# Altium footprint library Capacitance.PcbLib: 176 footprints (part 6 of 11)
Each footprint in its own frame and in the unit in brackets; x right, y up, seen from the top. Pads: shape width x height; smd on the part's side, far side on the other; paste and mask are expansions set on the pad; w line width, h text height; cw(c..) or ccw(c..) is an arc to the next point about the centre after c.
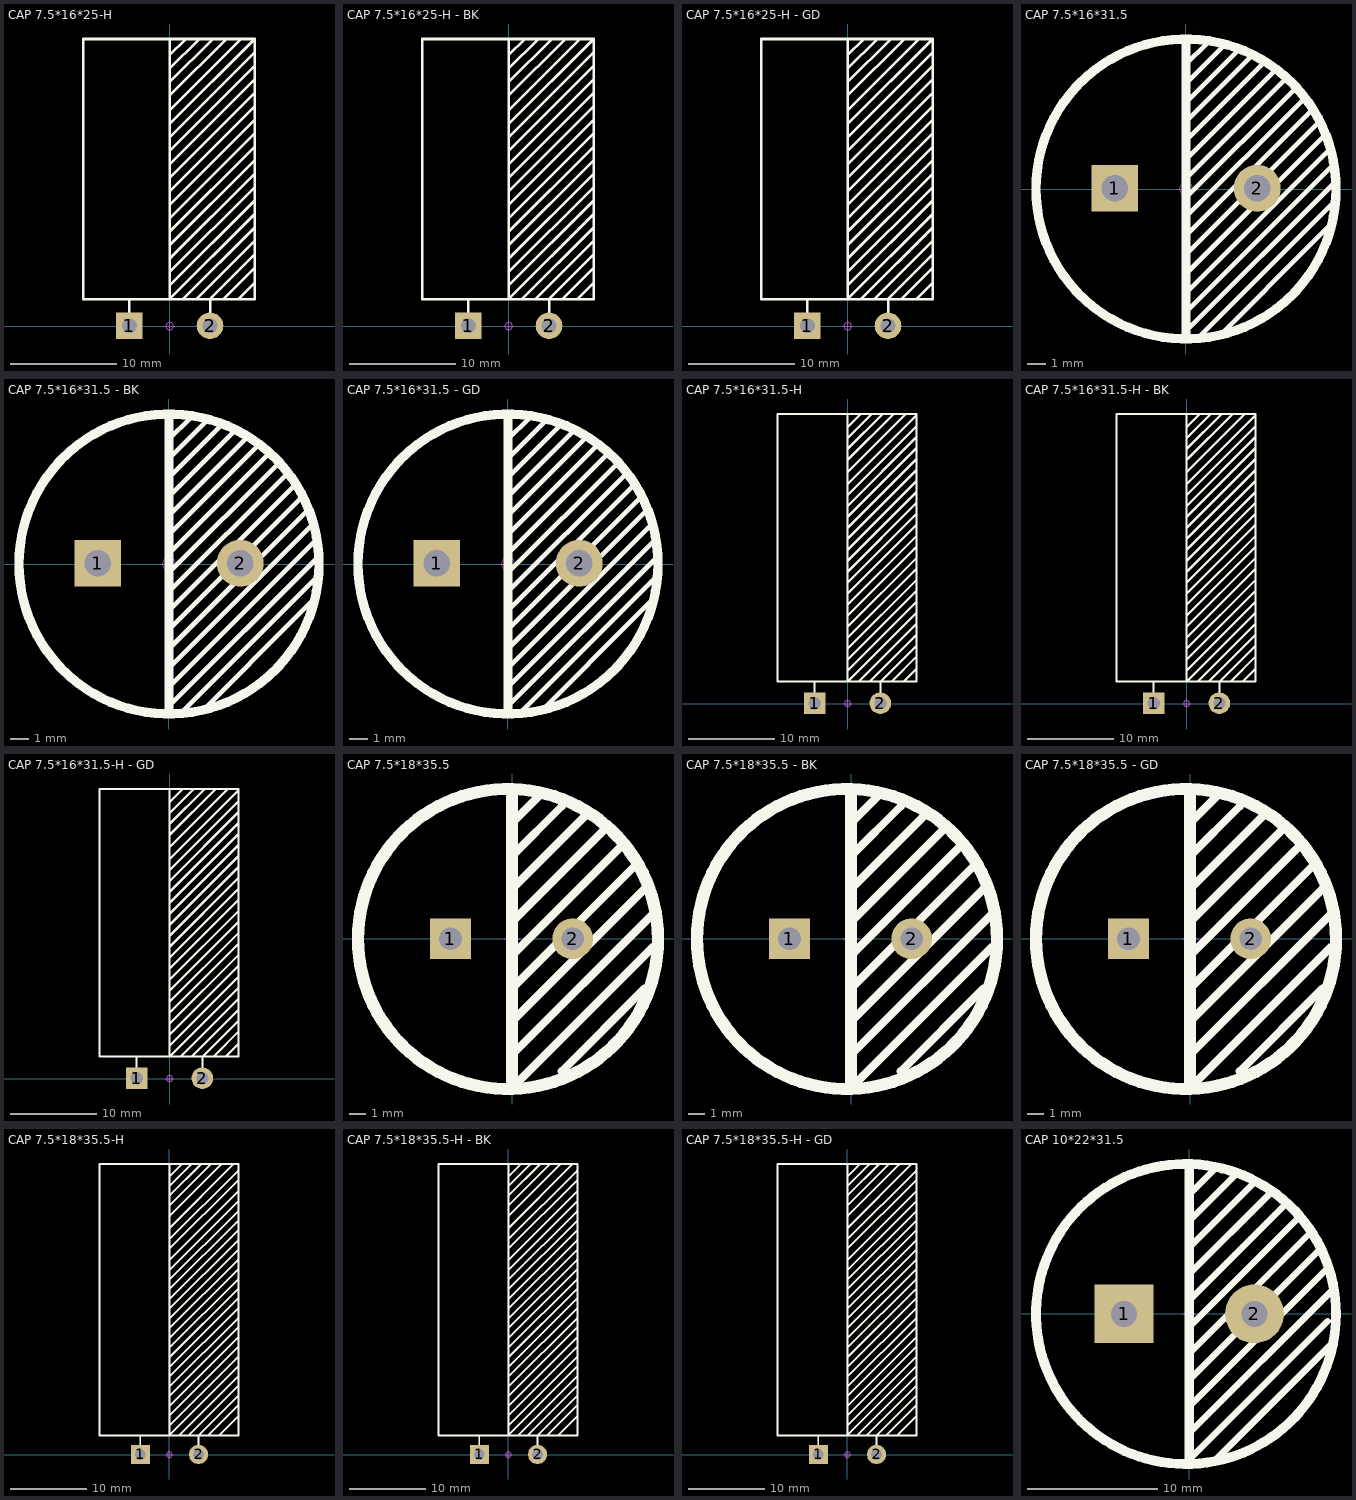
[diagram p5: the footprints below, top view; thin cyan lines are the x and y axes]

## CAP 7.5*16*25-H [mm] "ï¿½Å¾ï¿½7.5mmÖ±ï¿½ï¿½16mmï¿½ß¶ï¿½25mm"
pads (2):
  rect 2.5x2.5 hole 1.4: 1(-3.8,0.038)
  round 2.5 hole 1.4: 2(3.8,0.038)
Top Overlay:
  lines w0.254: -3.81,1.27 -3.81,2.54 ; 0,3.81 8.001,11.811 ; 0,5.08 8.001,13.081 ; 0,6.35 8.001,14.351 ; 0,7.62 7.938,15.557 ; 0,8.89 8.001,16.891 ; 0,10.16 7.938,18.098 ; 0,11.43 8.001,19.431 ; 0,12.7 7.938,20.637 ; 0,13.97 7.938,21.907 ; 0,15.24 7.938,23.177 ; 0,16.51 7.938,24.447 ; 0,17.78 7.938,25.717 ; 0,19.05 7.929,26.979 ; 0,20.32 6.731,27.051 ; 0,21.717 5.334,27.051 ; 0,22.987 4.064,27.051 ; 0,24.257 2.794,27.051 ; 0,25.527 1.524,27.051 ; 0,27.051 0,2.54 8.001,10.541 ; 1.27,2.54 8.001,9.271 ; 2.54,2.54 8.001,8.001 ; 3.81,1.27 3.81,2.54 8.001,6.731 ; 5.08,2.54 8.001,5.461 ; 6.477,2.54 8.001,4.064 ; -8.128,2.54 8.001,2.54 8.001,27.051 -8.128,27.051 -8.128,2.54
Mechanical 15:
  circle w0.05: c0,0 r0.35
  lines w0.05: -0.5,0 0.5,0 ; 0,-0.5 0,0.5
3D body "CAP 7.5X16X25-H.STEP": height 16.03, standoff -3.47, extent -8.05,-0.462 7.96,26.948

## CAP 7.5*16*25-H - BK [mm] "ï¿½Å¾ï¿½7.5mmÖ±ï¿½ï¿½16mmï¿½ß¶ï¿½25mm"
pads (2):
  rect 2.5x2.5 hole 1.4: 1(-3.8,0.038)
  round 2.5 hole 1.4: 2(3.8,0.038)
Top Overlay:
  lines w0.254: -3.81,1.27 -3.81,2.54 ; 0,3.81 8.001,11.811 ; 0,5.08 8.001,13.081 ; 0,6.35 8.001,14.351 ; 0,7.62 7.938,15.557 ; 0,8.89 8.001,16.891 ; 0,10.16 7.938,18.098 ; 0,11.43 8.001,19.431 ; 0,12.7 7.938,20.637 ; 0,13.97 7.938,21.907 ; 0,15.24 7.938,23.177 ; 0,16.51 7.938,24.447 ; 0,17.78 7.938,25.717 ; 0,19.05 7.929,26.979 ; 0,20.32 6.731,27.051 ; 0,21.717 5.334,27.051 ; 0,22.987 4.064,27.051 ; 0,24.257 2.794,27.051 ; 0,25.527 1.524,27.051 ; 0,27.051 0,2.54 8.001,10.541 ; 1.27,2.54 8.001,9.271 ; 2.54,2.54 8.001,8.001 ; 3.81,1.27 3.81,2.54 8.001,6.731 ; 5.08,2.54 8.001,5.461 ; 6.477,2.54 8.001,4.064 ; -8.128,2.54 8.001,2.54 8.001,27.051 -8.128,27.051 -8.128,2.54
Mechanical 15:
  circle w0.05: c0,0 r0.35
  lines w0.05: -0.5,0 0.5,0 ; 0,-0.5 0,0.5
3D body "CAP 7.5X16X25-H.STEP": height 16.03, standoff -3.48, extent -8.05,-0.462 7.96,26.948

## CAP 7.5*16*25-H - GD [mm] "ï¿½Å¾ï¿½7.5mmÖ±ï¿½ï¿½16mmï¿½ß¶ï¿½25mm"
pads (2):
  rect 2.5x2.5 hole 1.4: 1(-3.8,0.038)
  round 2.5 hole 1.4: 2(3.8,0.038)
Top Overlay:
  lines w0.254: -3.81,1.27 -3.81,2.54 ; 0,3.81 8.001,11.811 ; 0,5.08 8.001,13.081 ; 0,6.35 8.001,14.351 ; 0,7.62 7.938,15.557 ; 0,8.89 8.001,16.891 ; 0,10.16 7.938,18.098 ; 0,11.43 8.001,19.431 ; 0,12.7 7.938,20.637 ; 0,13.97 7.938,21.907 ; 0,15.24 7.938,23.177 ; 0,16.51 7.938,24.447 ; 0,17.78 7.938,25.717 ; 0,19.05 7.929,26.979 ; 0,20.32 6.731,27.051 ; 0,21.717 5.334,27.051 ; 0,22.987 4.064,27.051 ; 0,24.257 2.794,27.051 ; 0,25.527 1.524,27.051 ; 0,27.051 0,2.54 8.001,10.541 ; 1.27,2.54 8.001,9.271 ; 2.54,2.54 8.001,8.001 ; 3.81,1.27 3.81,2.54 8.001,6.731 ; 5.08,2.54 8.001,5.461 ; 6.477,2.54 8.001,4.064 ; -8.128,2.54 8.001,2.54 8.001,27.051 -8.128,27.051 -8.128,2.54
Mechanical 15:
  circle w0.05: c0,0 r0.35
  lines w0.05: -0.5,0 0.5,0 ; 0,-0.5 0,0.5
3D body "CAP 7.5X16X25-H.STEP": height 16.03, standoff -3.48, extent -8.05,-0.462 7.96,26.948

## CAP 7.5*16*31.5 [mm] "ï¿½Å¾ï¿½7.5mmÖ±ï¿½ï¿½16mmï¿½ß¶ï¿½31.5mm"
pads (2):
  rect 2.5x2.5 hole 1.4: 1(-3.8,0.038)
  round 2.5 hole 1.4: 2(3.8,0.038)
Top Overlay:
  circle w0.5: c0,0 r8
  lines w0.254: 0,-7.582 8.001,0.419 ; 0,-6.566 7.874,1.308 ; 0,-5.55 7.62,2.07 ; 0,-4.534 7.366,2.832 ; 0,-3.518 6.972,3.454 ; 0,-2.502 6.604,4.102 ; 0,-1.486 6.223,4.737 ; 0,-0.47 5.905,5.436 ; 0,0.546 5.296,5.842 ; 0,1.562 4.826,6.388 ; 0,2.578 4.064,6.642 ; 0,3.594 3.556,7.15 ; 0,4.61 2.54,7.15 2.769,7.379 ; 0,5.626 2.032,7.658 ; 0,6.642 1.143,7.785 ; 0.66,-7.938 7.938,-0.66 ; 2.032,-7.582 6.604,-3.01 7.81,-1.803
  lines w0.5: 0,-7.963 0,7.963
Mechanical 15:
  circle w0.05: c0,0 r0.35
  lines w0.05: -0.5,0 0.5,0 ; 0,-0.5 0,0.5
3D body "CAP 7.5X16X31.STEP": height 31.53, standoff -3.38, extent -8,-7.998 8.01,7.998

## CAP 7.5*16*31.5 - BK [mm] "ï¿½Å¾ï¿½7.5mmÖ±ï¿½ï¿½16mmï¿½ß¶ï¿½31.5mm"
pads (2):
  rect 2.5x2.5 hole 1.4: 1(-3.8,0.038)
  round 2.5 hole 1.4: 2(3.8,0.038)
Top Overlay:
  circle w0.5: c0,0 r8
  lines w0.254: 0,-7.582 8.001,0.419 ; 0,-6.566 7.874,1.308 ; 0,-5.55 7.62,2.07 ; 0,-4.534 7.366,2.832 ; 0,-3.518 6.972,3.454 ; 0,-2.502 6.604,4.102 ; 0,-1.486 6.223,4.737 ; 0,-0.47 5.905,5.436 ; 0,0.546 5.296,5.842 ; 0,1.562 4.826,6.388 ; 0,2.578 4.064,6.642 ; 0,3.594 3.556,7.15 ; 0,4.61 2.54,7.15 2.769,7.379 ; 0,5.626 2.032,7.658 ; 0,6.642 1.143,7.785 ; 0.66,-7.938 7.938,-0.66 ; 2.032,-7.582 6.604,-3.01 7.81,-1.803
  lines w0.5: 0,-7.963 0,7.963
Mechanical 15:
  circle w0.05: c0,0 r0.35
  lines w0.05: -0.5,0 0.5,0 ; 0,-0.5 0,0.5
3D body "CAP 7.5X16X31.5.STEP": height 31.54, standoff -3.37, extent -8,-7.998 8.01,7.998

## CAP 7.5*16*31.5 - GD [mm] "ï¿½Å¾ï¿½7.5mmÖ±ï¿½ï¿½16mmï¿½ß¶ï¿½31.5mm"
pads (2):
  rect 2.5x2.5 hole 1.4: 1(-3.8,0.038)
  round 2.5 hole 1.4: 2(3.8,0.038)
Top Overlay:
  circle w0.5: c0,0 r8
  lines w0.254: 0,-7.582 8.001,0.419 ; 0,-6.566 7.874,1.308 ; 0,-5.55 7.62,2.07 ; 0,-4.534 7.366,2.832 ; 0,-3.518 6.972,3.454 ; 0,-2.502 6.604,4.102 ; 0,-1.486 6.223,4.737 ; 0,-0.47 5.905,5.436 ; 0,0.546 5.296,5.842 ; 0,1.562 4.826,6.388 ; 0,2.578 4.064,6.642 ; 0,3.594 3.556,7.15 ; 0,4.61 2.54,7.15 2.769,7.379 ; 0,5.626 2.032,7.658 ; 0,6.642 1.143,7.785 ; 0.66,-7.938 7.938,-0.66 ; 2.032,-7.582 6.604,-3.01 7.81,-1.803
  lines w0.5: 0,-7.963 0,7.963
Mechanical 15:
  circle w0.05: c0,0 r0.35
  lines w0.05: -0.5,0 0.5,0 ; 0,-0.5 0,0.5
3D body "CAP 7.5X16X31.5.STEP": height 31.54, standoff -3.37, extent -8,-7.998 8.01,7.998

## CAP 7.5*16*31.5-H [mm] "ï¿½Å¾ï¿½7.5mmÖ±ï¿½ï¿½16mmï¿½ß¶ï¿½31.5mm"
pads (2):
  rect 2.5x2.5 hole 1.4: 1(-3.8,0.038)
  round 2.5 hole 1.4: 2(3.8,0.038)
Top Overlay:
  lines w0.254: -3.81,1.27 -3.81,2.54 ; 0,3.81 8.001,11.811 ; 0,5.08 8.001,13.081 ; 0,6.35 8.001,14.351 ; 0,7.62 7.938,15.557 ; 0,8.89 8.001,16.891 ; 0,10.16 7.938,18.098 ; 0,11.43 8.001,19.431 ; 0,12.7 7.938,20.637 ; 0,13.97 7.938,21.907 ; 0,15.24 7.938,23.177 ; 0,16.51 7.938,24.447 ; 0,17.78 7.938,25.717 ; 0,19.05 7.929,26.979 ; 0,20.32 7.938,28.258 ; 0,21.59 7.938,29.527 ; 0,22.86 7.938,30.797 ; 0,24.13 7.938,32.067 ; 0,25.4 7.929,33.329 ; 0,26.797 6.731,33.528 ; 0,28.194 5.334,33.528 ; 0,29.464 4.064,33.528 ; 0,30.734 2.794,33.528 ; 0,32.004 1.524,33.528 ; 0,33.528 0,2.54 8.001,10.541 ; 1.27,2.54 8.001,9.271 ; 2.54,2.54 8.001,8.001 ; 3.81,1.27 3.81,2.54 8.001,6.731 ; 5.08,2.54 8.001,5.461 ; 6.477,2.54 8.001,4.064 ; -8.128,2.54 8.001,2.54 8.001,33.528 -8.128,33.528 -8.128,2.54
Mechanical 15:
  circle w0.05: c0,0 r0.35
  lines w0.05: -0.5,0 0.5,0 ; 0,-0.5 0,0.5
3D body "CAP 7.5X16X31.5-H.STEP": height 16.03, standoff -3.47, extent -8.05,-0.462 7.96,33.448

## CAP 7.5*16*31.5-H - BK [mm] "ï¿½Å¾ï¿½7.5mmÖ±ï¿½ï¿½16mmï¿½ß¶ï¿½31.5mm"
pads (2):
  rect 2.5x2.5 hole 1.4: 1(-3.8,0.038)
  round 2.5 hole 1.4: 2(3.8,0.038)
Top Overlay:
  lines w0.254: -3.81,1.27 -3.81,2.54 ; 0,3.81 8.001,11.811 ; 0,5.08 8.001,13.081 ; 0,6.35 8.001,14.351 ; 0,7.62 7.938,15.557 ; 0,8.89 8.001,16.891 ; 0,10.16 7.938,18.098 ; 0,11.43 8.001,19.431 ; 0,12.7 7.938,20.637 ; 0,13.97 7.938,21.907 ; 0,15.24 7.938,23.177 ; 0,16.51 7.938,24.447 ; 0,17.78 7.938,25.717 ; 0,19.05 7.929,26.979 ; 0,20.32 7.938,28.258 ; 0,21.59 7.938,29.527 ; 0,22.86 7.938,30.797 ; 0,24.13 7.938,32.067 ; 0,25.4 7.929,33.329 ; 0,26.797 6.731,33.528 ; 0,28.194 5.334,33.528 ; 0,29.464 4.064,33.528 ; 0,30.734 2.794,33.528 ; 0,32.004 1.524,33.528 ; 0,33.528 0,2.54 8.001,10.541 ; 1.27,2.54 8.001,9.271 ; 2.54,2.54 8.001,8.001 ; 3.81,1.27 3.81,2.54 8.001,6.731 ; 5.08,2.54 8.001,5.461 ; 6.477,2.54 8.001,4.064 ; -8.128,2.54 8.001,2.54 8.001,33.528 -8.128,33.528 -8.128,2.54
Mechanical 15:
  circle w0.05: c0,0 r0.35
  lines w0.05: -0.5,0 0.5,0 ; 0,-0.5 0,0.5
3D body "CAP 7.5X16X31.5-H.STEP": height 16.03, standoff -3.48, extent -8.05,-0.462 7.96,33.448

## CAP 7.5*16*31.5-H - GD [mm] "ï¿½Å¾ï¿½7.5mmÖ±ï¿½ï¿½16mmï¿½ß¶ï¿½31.5mm"
pads (2):
  rect 2.5x2.5 hole 1.4: 1(-3.8,0.038)
  round 2.5 hole 1.4: 2(3.8,0.038)
Top Overlay:
  lines w0.254: -3.81,1.27 -3.81,2.54 ; 0,3.81 8.001,11.811 ; 0,5.08 8.001,13.081 ; 0,6.35 8.001,14.351 ; 0,7.62 7.938,15.557 ; 0,8.89 8.001,16.891 ; 0,10.16 7.938,18.098 ; 0,11.43 8.001,19.431 ; 0,12.7 7.938,20.637 ; 0,13.97 7.938,21.907 ; 0,15.24 7.938,23.177 ; 0,16.51 7.938,24.447 ; 0,17.78 7.938,25.717 ; 0,19.05 7.929,26.979 ; 0,20.32 7.938,28.258 ; 0,21.59 7.938,29.527 ; 0,22.86 7.938,30.797 ; 0,24.13 7.938,32.067 ; 0,25.4 7.929,33.329 ; 0,26.797 6.731,33.528 ; 0,28.194 5.334,33.528 ; 0,29.464 4.064,33.528 ; 0,30.734 2.794,33.528 ; 0,32.004 1.524,33.528 ; 0,33.528 0,2.54 8.001,10.541 ; 1.27,2.54 8.001,9.271 ; 2.54,2.54 8.001,8.001 ; 3.81,1.27 3.81,2.54 8.001,6.731 ; 5.08,2.54 8.001,5.461 ; 6.477,2.54 8.001,4.064 ; -8.128,2.54 8.001,2.54 8.001,33.528 -8.128,33.528 -8.128,2.54
Mechanical 15:
  circle w0.05: c0,0 r0.35
  lines w0.05: -0.5,0 0.5,0 ; 0,-0.5 0,0.5
3D body "CAP 7.5X16X31.5-H.STEP": height 16.03, standoff -3.48, extent -8.05,-0.462 7.96,33.448

## CAP 7.5*18*35.5 [mm] "ï¿½Å¾ï¿½7.5mmÖ±ï¿½ï¿½18mmï¿½ß¶ï¿½35.5mm"
pads (2):
  rect 2.5x2.5 hole 1.4: 1(-3.78,0)
  round 2.5 hole 1.4: 2(3.72,0)
Top Overlay:
  circle w0.754: c-0.248,-0.013 r9.2
  lines w0.504: 0,-9.144 8.636,-0.508 ; 0,-7.112 8.636,1.524 ; 0,-5.08 8.128,3.048 ; 0,-3.048 7.62,4.572 ; 0,-1.016 6.731,5.715 ; 0,1.016 5.715,6.731 ; 0,3.048 4.572,7.62 ; 0,5.08 3.048,8.128 ; 0,7.112 1.778,8.89 ; 3.048,-8.128 8.128,-3.048
  lines w0.754: 0,-8.8 0,8.8
Mechanical 15:
  circle w0.05: c0,0 r0.35
  lines w0.05: -0.5,0 0.5,0 ; 0,-0.5 0,0.5
3D body "CAP 7.5X18X35.5.STEP": height 35.54, standoff -3.37, extent -9,-8.997 9.01,8.997

## CAP 7.5*18*35.5 - BK [mm] "ï¿½Å¾ï¿½7.5mmÖ±ï¿½ï¿½18mmï¿½ß¶ï¿½35.5mm"
pads (2):
  rect 2.5x2.5 hole 1.4: 1(-3.78,0)
  round 2.5 hole 1.4: 2(3.72,0)
Top Overlay:
  circle w0.754: c-0.248,-0.013 r9.2
  lines w0.504: 0,-9.144 8.636,-0.508 ; 0,-7.112 8.636,1.524 ; 0,-5.08 8.128,3.048 ; 0,-3.048 7.62,4.572 ; 0,-1.016 6.731,5.715 ; 0,1.016 5.715,6.731 ; 0,3.048 4.572,7.62 ; 0,5.08 3.048,8.128 ; 0,7.112 1.778,8.89 ; 3.048,-8.128 8.128,-3.048
  lines w0.754: 0,-8.8 0,8.8
Mechanical 15:
  circle w0.05: c0,0 r0.35
  lines w0.05: -0.5,0 0.5,0 ; 0,-0.5 0,0.5
3D body "CAP 7.5X18X35.5.STEP": height 35.54, standoff -3.37, extent -9,-8.997 9.01,8.997

## CAP 7.5*18*35.5 - GD [mm] "ï¿½Å¾ï¿½7.5mmÖ±ï¿½ï¿½18mmï¿½ß¶ï¿½35.5mm"
pads (2):
  rect 2.5x2.5 hole 1.4: 1(-3.78,0)
  round 2.5 hole 1.4: 2(3.72,0)
Top Overlay:
  circle w0.754: c-0.248,-0.013 r9.2
  lines w0.504: 0,-9.144 8.636,-0.508 ; 0,-7.112 8.636,1.524 ; 0,-5.08 8.128,3.048 ; 0,-3.048 7.62,4.572 ; 0,-1.016 6.731,5.715 ; 0,1.016 5.715,6.731 ; 0,3.048 4.572,7.62 ; 0,5.08 3.048,8.128 ; 0,7.112 1.778,8.89 ; 3.048,-8.128 8.128,-3.048
  lines w0.754: 0,-8.8 0,8.8
Mechanical 15:
  circle w0.05: c0,0 r0.35
  lines w0.05: -0.5,0 0.5,0 ; 0,-0.5 0,0.5
3D body "CAP 7.5X18X35.5.STEP": height 35.56, standoff -3.35, extent -8.989,-8.992 9.021,9.002

## CAP 7.5*18*35.5-H [mm] "ï¿½Å¾ï¿½7.5mmÖ±ï¿½ï¿½18mmï¿½ß¶ï¿½35.5mm"
pads (2):
  rect 2.5x2.5 hole 1.4: 1(-3.8,0.038)
  round 2.5 hole 1.4: 2(3.8,0.038)
Top Overlay:
  lines w0.254: -3.81,1.27 -3.81,2.54 ; 0,3.81 8.955,12.765 ; 0,5.08 8.95,14.03 ; 0,6.35 8.975,15.325 ; 0,7.62 8.94,16.56 ; 0,8.89 8.965,17.855 ; 0,10.16 8.99,19.15 ; 0,11.43 8.985,20.415 ; 0,12.7 8.98,21.68 ; 0,13.97 8.975,22.945 ; 0,15.24 8.97,24.21 ; 0,16.51 8.965,25.475 ; 0,17.78 8.99,26.77 ; 0,19.05 8.985,28.035 ; 0,20.32 8.98,29.3 ; 0,21.59 8.975,30.565 ; 0,22.86 8.97,31.83 ; 0,24.13 8.965,33.095 ; 0,25.4 8.99,34.39 ; 0,26.88 8.97,35.85 ; 0,28.15 8.965,37.115 ; 0,37.98 0,2.54 8.99,11.53 ; 0.02,29.62 8.36,37.96 ; 0.06,31.2 6.791,37.931 ; 0.06,32.597 5.394,37.931 ; 0.06,33.867 4.124,37.931 ; 0.06,35.137 2.854,37.931 ; 0.06,36.407 1.584,37.931 ; 1.27,2.54 8.995,10.265 ; 2.54,2.54 8.94,8.94 ; 3.81,1.27 3.81,2.54 9.005,7.735 ; 5.08,2.54 8.98,6.44 ; 6.477,2.54 8.989,5.052 ; -9.12,2.54 9,2.54 9,37.98 -9.12,37.98 -9.12,2.54
Mechanical 15:
  circle w0.05: c0,0 r0.35
  lines w0.05: -0.5,0 0.5,0 ; 0,-0.5 0,0.5
3D body "CAP 7.5X18X35.5-H.STEP": height 18.03, standoff -3.47, extent -9.05,-0.462 8.96,37.948

## CAP 7.5*18*35.5-H - BK [mm] "ï¿½Å¾ï¿½7.5mmÖ±ï¿½ï¿½18mmï¿½ß¶ï¿½35.5mm"
pads (2):
  rect 2.5x2.5 hole 1.4: 1(-3.8,0.038)
  round 2.5 hole 1.4: 2(3.8,0.038)
Top Overlay:
  lines w0.254: -3.81,1.27 -3.81,2.54 ; 0,3.81 8.955,12.765 ; 0,5.08 8.95,14.03 ; 0,6.35 8.975,15.325 ; 0,7.62 8.94,16.56 ; 0,8.89 8.965,17.855 ; 0,10.16 8.99,19.15 ; 0,11.43 8.985,20.415 ; 0,12.7 8.98,21.68 ; 0,13.97 8.975,22.945 ; 0,15.24 8.97,24.21 ; 0,16.51 8.965,25.475 ; 0,17.78 8.99,26.77 ; 0,19.05 8.985,28.035 ; 0,20.32 8.98,29.3 ; 0,21.59 8.975,30.565 ; 0,22.86 8.97,31.83 ; 0,24.13 8.965,33.095 ; 0,25.4 8.99,34.39 ; 0,26.88 8.97,35.85 ; 0,28.15 8.965,37.115 ; 0,37.98 0,2.54 8.99,11.53 ; 0.02,29.62 8.36,37.96 ; 0.06,31.2 6.791,37.931 ; 0.06,32.597 5.394,37.931 ; 0.06,33.867 4.124,37.931 ; 0.06,35.137 2.854,37.931 ; 0.06,36.407 1.584,37.931 ; 1.27,2.54 8.995,10.265 ; 2.54,2.54 8.94,8.94 ; 3.81,1.27 3.81,2.54 9.005,7.735 ; 5.08,2.54 8.98,6.44 ; 6.477,2.54 8.989,5.052 ; -9.12,2.54 -9.12,37.98 9,37.98 9,2.54 -9.12,2.54
Mechanical 15:
  circle w0.05: c0,0 r0.35
  lines w0.05: -0.5,0 0.5,0 ; 0,-0.5 0,0.5
3D body "CAP 7.5X18X35.5-H.STEP": height 18.03, standoff -3.48, extent -9.05,-0.462 8.96,37.948

## CAP 7.5*18*35.5-H - GD [mm] "ï¿½Å¾ï¿½7.5mmÖ±ï¿½ï¿½18mmï¿½ß¶ï¿½35.5mm"
pads (2):
  rect 2.5x2.5 hole 1.4: 1(-3.8,0.038)
  round 2.5 hole 1.4: 2(3.8,0.038)
Top Overlay:
  lines w0.254: -3.81,1.27 -3.81,2.54 ; 0,3.81 8.955,12.765 ; 0,5.08 8.95,14.03 ; 0,6.35 8.975,15.325 ; 0,7.62 8.94,16.56 ; 0,8.89 8.965,17.855 ; 0,10.16 8.99,19.15 ; 0,11.43 8.985,20.415 ; 0,12.7 8.98,21.68 ; 0,13.97 8.975,22.945 ; 0,15.24 8.97,24.21 ; 0,16.51 8.965,25.475 ; 0,17.78 8.99,26.77 ; 0,19.05 8.985,28.035 ; 0,20.32 8.98,29.3 ; 0,21.59 8.975,30.565 ; 0,22.86 8.97,31.83 ; 0,24.13 8.965,33.095 ; 0,25.4 8.99,34.39 ; 0,26.88 8.97,35.85 ; 0,28.15 8.965,37.115 ; 0,37.98 0,2.54 8.99,11.53 ; 0.02,29.62 8.36,37.96 ; 0.06,31.2 6.791,37.931 ; 0.06,32.597 5.394,37.931 ; 0.06,33.867 4.124,37.931 ; 0.06,35.137 2.854,37.931 ; 0.06,36.407 1.584,37.931 ; 1.27,2.54 8.995,10.265 ; 2.54,2.54 8.94,8.94 ; 3.81,1.27 3.81,2.54 9.005,7.735 ; 5.08,2.54 8.98,6.44 ; 6.477,2.54 8.989,5.052 ; -9.12,2.54 -9.12,37.98 9,37.98 9,2.54 -9.12,2.54
Mechanical 15:
  circle w0.05: c0,0 r0.35
  lines w0.05: -0.5,0 0.5,0 ; 0,-0.5 0,0.5
3D body "CAP 7.5X18X35.5-H.STEP": height 18.03, standoff -3.48, extent -9.05,-0.462 8.96,37.948

## CAP 10*22*31.5 [mm] "ï¿½Å¾ï¿½10mmÖ±ï¿½ï¿½22mmï¿½ß¶ï¿½31.5mm"
pads (2):
  rect 4.5x4.5 hole 2: 1(-5,0)
  round 4.5 hole 2: 2(5,0)
Top Overlay:
  circle w0.754: c-0.248,-0.013 r11.5
  lines w0.504: 0,-7.112 10.541,3.429 ; 0,-5.08 10.033,4.953 ; 0,-3.048 9.271,6.223 ; 0,-1.016 8.382,7.366 ; 0,1.016 7.493,8.509 ; 0,3.048 6.223,9.271 ; 0,5.08 4.953,10.033 ; 0,7.112 3.556,10.668 ; 0.254,-10.922 10.604,-0.572 ; 0.254,-8.89 10.858,1.714 ; 0.254,9.398 2.032,11.176 ; 1.778,-11.43 11.049,-2.159
  lines w0.754: 0,-11.25 0,11.25
Mechanical 15:
  circle w0.05: c0,0 r0.35
  lines w0.05: -0.5,0 0.5,0 ; 0,-0.5 0,0.5
3D body "CAP 10X22X31.5.STEP": height 31.53, standoff -3.38, extent -11,-10.997 11.01,10.997